# Altium footprint library THU VIEN V1.PcbLib: 400 footprints (part 17 of 25)
Each footprint in its own frame and in the unit in brackets; x right, y up, seen from the top. Pads: shape width x height; smd on the part's side, far side on the other; paste and mask are expansions set on the pad; w line width, h text height; cw(c..) or ccw(c..) is an arc to the next point about the centre after c.
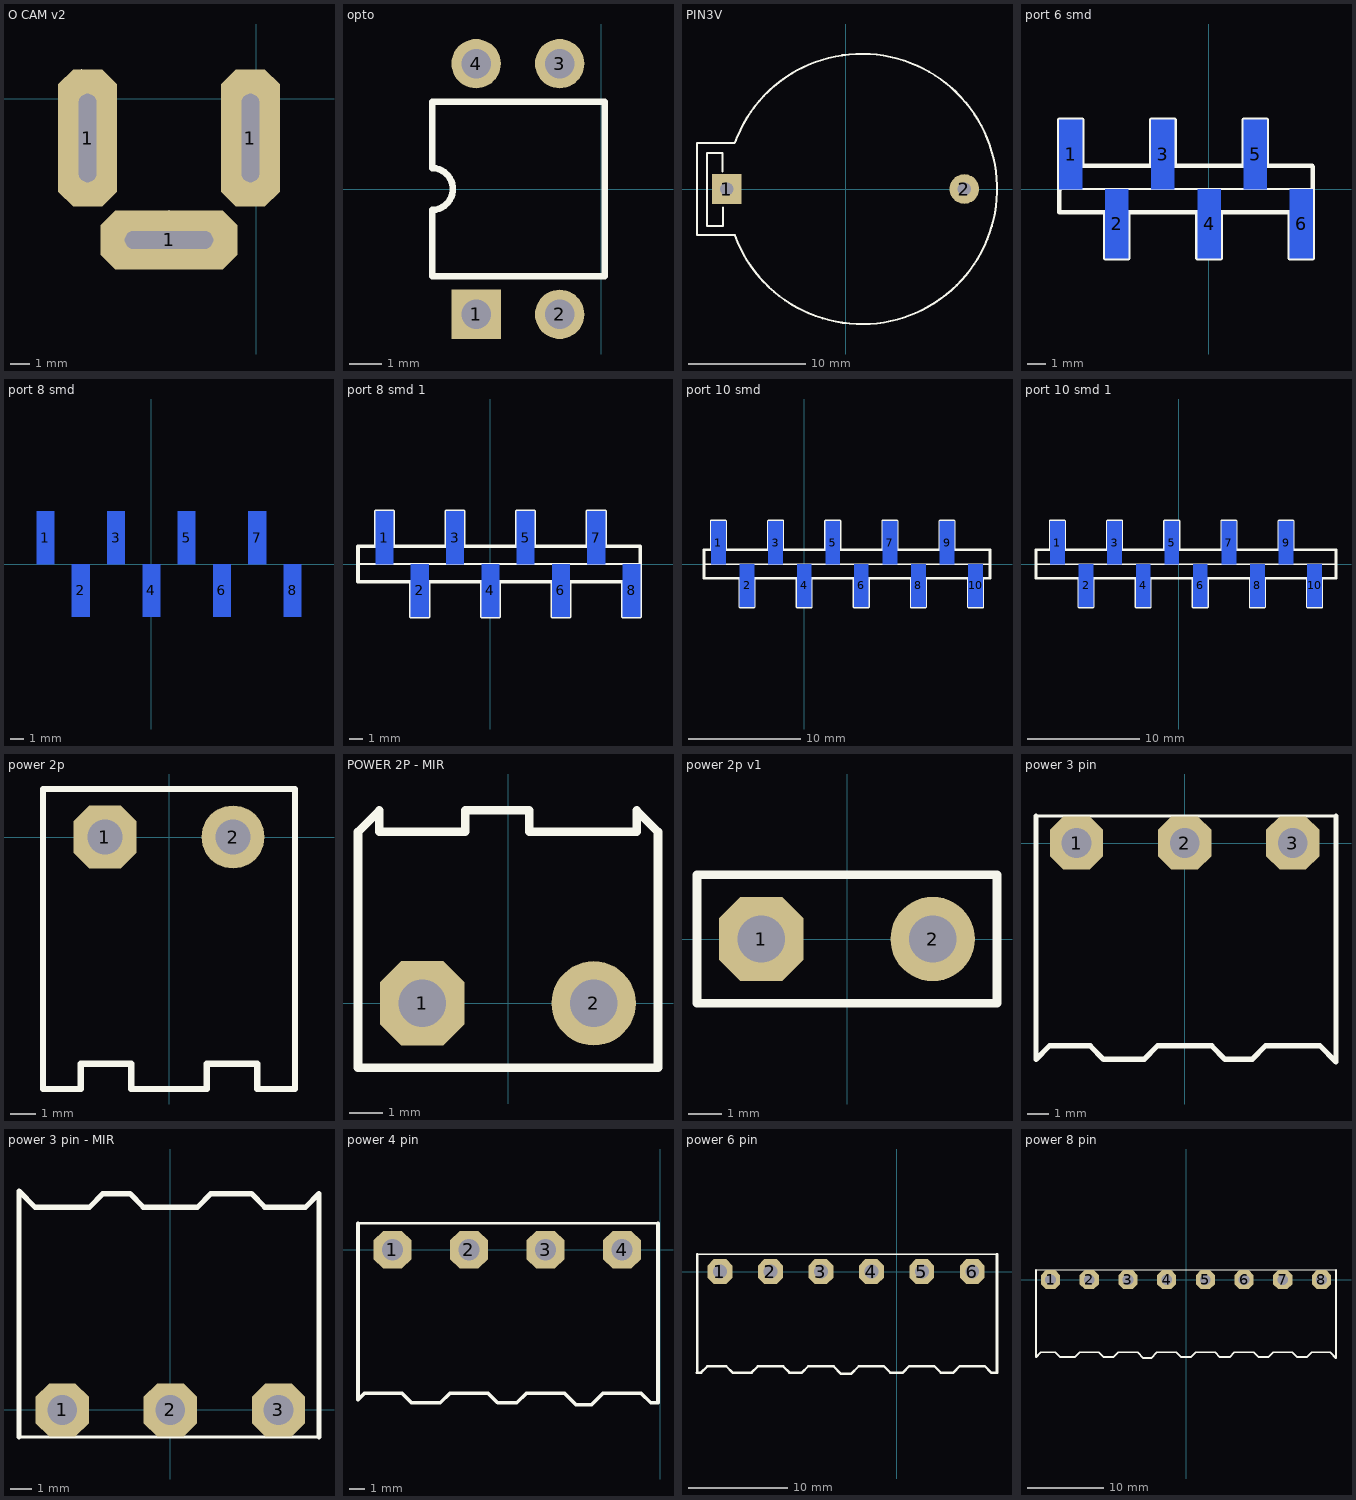
[diagram p16: the footprints below, top view; thin cyan lines are the x and y axes]

## O CAM v2 [mm]
pads (5):
  round 0.254 hole 0.127: 0(-4.45,-7.2) 0(-0.3,-2)
  oct 3x7 hole 0.9 slot 4.5 at 90 deg: 1(-8.6,-2) 1(-0.3,-2)
  oct 7x3 hole 0.9 slot 4.5 at 0 deg: 1(-4.45,-7.2)
Top Overlay:
  lines w0.025: -8.9,0 -8.9,1.5 ; -8.6,-4.5 -8.6,0.2 ; -4.45,-7.675 -4.45,-5.675 ; -4.45,-7.2 -2.45,-7.2
  lines w0.051: -8.9,-4 -8.9,0 ; -8.9,-4 -8.3,-4 ; -8.9,-4 -8.9,0 ; -8.9,-4 -8.3,-4 ; -8.9,0 -8.3,0 ; -8.9,0 -8.3,0 ; -8.3,-4 -8.3,0 ; -8.3,-4 -8.3,0 ; -6.45,-7.5 -2.45,-7.5 ; -6.45,-7.5 -6.45,-6.9 ; -6.45,-7.5 -2.45,-7.5 ; -6.45,-7.5 -6.45,-6.9 ; -6.45,-7.5 -2.45,-7.5 ; -6.45,-6.9 -2.45,-6.9 ; -6.45,-6.9 -2.45,-6.9 ; -2.45,-7.5 -2.45,-6.9 ; -2.45,-7.5 -2.45,-6.9 ; -0.6,-4 -0.6,0 ; -0.6,-4 0,-4 ; -0.6,-4 -0.6,0 ; -0.6,-4 0,-4 ; -0.6,0 0,0 ; -0.6,0 0,0 ; 0,-4 0,0 ; 0,-4 0,0
3D body: height 15.59, standoff -2.5, extent -8.947,-7.5 -0.003,0.972

## opto [mm] "DIP; 8 Leads; Row Spacing 7.62 mm; Pitch 2.54 mm"
height 5.08
pads (4):
  rect 1.5x1.5 hole 0.9: 1(-3.81,-3.81)
  round 1.5 hole 0.9: 2(-1.27,-3.81) 3(-1.27,3.81) 4(-3.81,3.81)
Top Overlay:
  lines w0.2: -5.15,-2.65 0.102,-2.65 0.102,2.65 -5.15,2.65 -5.15,0.635 cw(c-5.15,0) -5.15,-0.635 -5.15,-2.65
3D body: height 3.81, standoff -5.37, extent -4.955,-6.551 -0.125,6.551

## PIN3V [mil]
pads (2):
  rect 100x100 hole 45: 1(-400,0)
  round 100 hole 45: 2(400,0)
Top Overlay:
  lines w7: -414,59 -414,121 -466,121 -466,-124 -413,-124 -413,-63 ; -373.67,155 -500,155 -500,-155 -372.07,-155 ; -372.4,156.07 cw(c55,0) -372.07,-156.96
3D body: height 278.16, standoff -137.2, extent -528.08,-446.83 601.84,448.84

## port 6 smd [mm]
pads (6):
  rect 1.27x3.81 smd far side: 1(-7.605,1.925) 2(-5.065,-1.885) 3(-2.525,1.925) 4(0.015,-1.885) 5(2.555,1.925) 6(5.095,-1.885)
Top Overlay:
  lines w0.127: -8.128,0 5.73,0.02
  lines w0.254: -8.24,-1.25 -8.24,1.29 -8.24,3.83 -6.97,3.83 -6.97,1.29 -3.16,1.29 -3.16,3.83 -1.89,3.83 -1.89,1.29 1.92,1.29 1.92,3.83 3.19,3.83 3.19,1.29 5.695,1.29 5.73,1.255 5.73,-1.25 5.73,-3.79 4.46,-3.79 4.46,-1.25 0.65,-1.25 0.65,-3.79 -0.62,-3.79 -0.62,-1.25 -4.43,-1.25 -4.43,-3.79 -5.7,-3.79 -5.7,-1.25 -8.24,-1.25

## port 8 smd [mm]
pads (8):
  rect 1.27x3.81 smd far side: 1(-7.605,1.925) 2(-5.065,-1.885) 3(-2.525,1.925) 4(0.015,-1.885) 5(2.555,1.925) 6(5.095,-1.885) 7(7.635,1.925) 8(10.175,-1.885)

## port 8 smd 1 [mm]
pads (8):
  rect 1.27x3.81 smd far side: 1(-7.605,1.925) 2(-5.065,-1.885) 3(-2.525,1.925) 4(0.015,-1.885) 5(2.555,1.925) 6(5.095,-1.885) 7(7.635,1.925) 8(10.175,-1.885)
Top Overlay:
  lines w0.127: -9.51,0.02 10.79,0.02
  lines w0.254: 10.79,1.29 8.27,1.29 8.27,3.83 7,3.83 7,1.29 3.19,1.29 3.19,3.83 1.92,3.83 1.92,1.29 -1.89,1.29 -1.89,3.83 -3.16,3.83 -3.16,1.29 -6.97,1.29 -6.97,3.83 -8.24,3.83 -8.24,1.29 -9.51,1.29 -9.51,-1.25 -5.7,-1.25 -5.7,-3.79 -4.43,-3.79 -4.43,-1.25 -0.62,-1.25 -0.62,-3.79 0.65,-3.79 0.65,-1.25 4.46,-1.25 4.46,-3.79 5.73,-3.79 5.73,-1.25 9.54,-1.25 9.54,-3.79 10.81,-3.79 10.81,1.27

## port 10 smd [mm]
pads (10):
  rect 1.27x3.81 smd far side: 1(-7.62,1.905) 2(-5.08,-1.905) 3(-2.54,1.905) 4(0,-1.905) 5(2.54,1.905) 6(5.08,-1.905) 7(7.62,1.905) 8(10.16,-1.905) 9(12.7,1.905) 10(15.24,-1.905)
Top Overlay:
  lines w0.127: -8.89,0 16.51,0
  lines w0.254: -8.89,-1.27 -5.715,-1.27 -5.715,-3.81 -4.445,-3.81 -4.445,-1.27 -0.635,-1.27 -0.635,-3.81 0.635,-3.81 0.635,-1.27 4.445,-1.27 4.445,-3.81 5.715,-3.81 5.715,-1.27 9.525,-1.27 9.525,-3.81 10.795,-3.81 10.795,-1.27 13.97,-1.27 14.605,-1.27 14.605,-3.81 15.875,-3.81 15.875,-1.27 16.51,-1.27 16.51,1.27 13.97,1.27 13.335,1.27 13.335,3.81 12.065,3.81 12.065,1.27 8.255,1.27 8.255,3.81 6.985,3.81 6.985,1.27 3.175,1.27 3.175,3.81 1.905,3.81 1.905,1.27 -1.905,1.27 -1.905,3.81 -3.175,3.81 -3.175,1.27 -6.985,1.27 -6.985,3.81 -8.255,3.81 -8.255,1.27 -8.89,1.27 -8.89,-1.27
3D body: height -0.48, standoff -10.32, extent -8.89,-2.5 16.51,2.5

## port 10 smd 1 [mm]
pads (10):
  rect 1.27x3.81 smd far side: 1(-10.795,1.905) 2(-8.255,-1.905) 3(-5.715,1.905) 4(-3.175,-1.905) 5(-0.635,1.905) 6(1.905,-1.905) 7(4.445,1.905) 8(6.985,-1.905) 9(9.525,1.905) 10(12.065,-1.905)
Top Overlay:
  lines w0.127: -12.7,0 13.97,0
  lines w0.254: -12.7,-1.27 -8.89,-1.27 -8.89,-3.81 -7.62,-3.81 -7.62,-1.27 -3.81,-1.27 -3.81,-3.81 -2.54,-3.81 -2.54,-1.27 1.27,-1.27 1.27,-3.81 2.54,-3.81 2.54,-1.27 6.35,-1.27 6.35,-3.81 7.62,-3.81 7.62,-1.27 11.43,-1.27 11.43,-3.81 12.7,-3.81 12.7,-1.27 13.97,-1.27 13.97,1.27 10.16,1.27 10.16,3.81 8.89,3.81 8.89,1.27 5.08,1.27 5.08,3.81 3.81,3.81 3.81,1.27 0,1.27 0,3.81 -1.27,3.81 -1.27,1.27 -5.08,1.27 -5.08,3.81 -6.35,3.81 -6.35,1.27 -10.16,1.27 -10.16,3.81 -11.43,3.81 -11.43,1.27 -12.7,1.27 -12.7,-1.27

## power 2p [mm]
pads (2):
  oct 2.5x2.5 hole 1.397: 1(-2.54,0)
  round 2.5 hole 1.397: 2(2.54,0)
Top Overlay:
  lines w0.254: 5,-10 3.5,-10 3.5,-9 1.5,-9 1.5,-10 -1.5,-10 -1.5,-9 -3.5,-9 -3.5,-10 -5,-10 -5,-5.635 -5,1.905 5,1.905 5,-9.945
3D body: height 8.77, standoff -3.7, extent -5.04,-10.273 4.96,1.727

## POWER 2P - MIR [mm]
pads (2):
  oct 2.5x2.5 hole 1.397: 1(-2.54,0)
  round 2.5 hole 1.397: 2(2.54,0)
Top Overlay:
  lines w0.254: -4.445,-1.905 -4.445,5.08 -3.81,5.715 -3.81,5.08 -1.27,5.08 -1.27,5.715 0.635,5.715 0.635,5.08 3.81,5.08 3.81,5.715 4.445,5.08 4.445,-1.905 -4.445,-1.905

## power 2p v1 [mm]
pads (2):
  oct 2.5x2.5 hole 1.397: 1(-2.54,0)
  round 2.5 hole 1.397: 2(2.54,0)
Top Overlay:
  lines w0.254: -4.445,-1.905 4.445,-1.905 4.445,1.905 -4.445,1.905 -4.445,-1.905
3D body: height 8.47, standoff -4, extent -5.04,-10.273 4.96,1.727

## power 3 pin [mm] "hkgvh"
pads (3):
  oct 2.5x2.5 hole 1.4: 1(-5.08,0) 2(0,0) 3(5.08,0)
Top Overlay:
  lines w0.15: -6.985,1.27 7.112,1.27
  lines w0.254: -6.985,1.27 -6.985,-10.16 -6.35,-9.525 -4.445,-9.525 -3.81,-10.16 -1.905,-10.16 -1.27,-9.525 1.27,-9.525 1.905,-10.16 3.175,-10.16 3.81,-9.525 6.35,-9.525 7.112,-10.287 7.112,1.27
3D body: height 8.47, standoff -4, extent -2.525,-10.273 7.475,1.727
3D body: height 8.47, standoff -4, extent -7.544,-10.267 2.456,1.733

## power 3 pin - MIR [mm] "hkgvh"
pads (3):
  oct 2.5x2.5 hole 1.4: 1(-5.08,0) 2(0,0) 3(5.08,0)
Top Overlay:
  lines w0.15: -7.112,-1.27 6.985,-1.27
  lines w0.254: -7.112,-1.27 -7.112,10.287 -6.35,9.525 -3.81,9.525 -3.175,10.16 -1.905,10.16 -1.27,9.525 1.27,9.525 1.905,10.16 3.81,10.16 4.445,9.525 6.35,9.525 6.985,10.16 6.985,-1.27

## power 4 pin [mm] "hkgvh"
pads (4):
  oct 2.5x2.5 hole 1.4: 1(-17.78,0) 2(-12.7,0) 3(-7.62,0) 4(-2.54,0)
Top Overlay:
  lines w0.15: -20.066,1.753 -0.152,1.753
  lines w0.254: -20.066,1.753 -20.066,0.86 -20.066,-0.111 -20.066,-1.206 -20.066,-6.921 -20.066,-9.957 -19.634,-9.525 -17.145,-9.525 -16.51,-10.16 -14.605,-10.16 -13.97,-9.525 -11.43,-9.525 -10.795,-10.16 -9.525,-10.16 -8.89,-9.525 -6.35,-9.525 -5.588,-10.287 -4.572,-10.287 -3.81,-9.525 -1.27,-9.525 -0.635,-10.16 -0.152,-10.16 -0.152,1.753
3D body: height 8.47, standoff -4, extent -10.094,-10.222 -0.094,1.778
3D body: height 8.47, standoff -4, extent -20.153,-10.222 -10.153,1.778

## power 6 pin [mm] "hkgvh"
pads (6):
  oct 2.5x2.5 hole 1.4: 1(-17.78,0) 2(-12.7,0) 3(-7.62,0) 4(-2.54,0) 5(2.54,0) 6(7.62,0)
Top Overlay:
  lines w0.15: -20.066,1.753 10.109,1.753
  lines w0.254: -20.066,1.753 -20.066,-10.135 -20.091,-10.16 -19.685,-10.16 -19.05,-9.525 -17.145,-9.525 -16.51,-10.16 -14.605,-10.16 -13.97,-9.525 -11.43,-9.525 -10.795,-10.16 -9.525,-10.16 -8.89,-9.525 -6.35,-9.525 -5.588,-10.287 -4.572,-10.287 -3.81,-9.525 -1.27,-9.525 -0.635,-10.16 0.635,-10.16 1.27,-9.525 3.81,-9.525 4.445,-10.16 5.715,-10.16 6.35,-9.525 8.89,-9.525 9.525,-10.16 10.109,-10.16 10.109,1.753
3D body: height 8.47, standoff -4, extent -0.025,-10.191 9.975,1.809
3D body: height 8.47, standoff -4, extent -10.094,-10.222 -0.094,1.778
3D body: height 8.47, standoff -4, extent -20.153,-10.222 -10.153,1.778

## power 8 pin [mm] "hkgvh"
pads (8):
  oct 2.5x2.5 hole 1.4: 1(-17.78,0) 2(-12.7,0) 3(-7.62,0) 4(-2.54,0) 5(2.54,0) 6(7.62,0) 7(12.7,0) 8(17.78,0)
Top Overlay:
  lines w0.15: -19.685,1.27 19.685,1.27
  lines w0.254: -19.685,1.27 -19.685,-10.16 -19.05,-9.525 -17.145,-9.525 -16.51,-10.16 -14.605,-10.16 -13.97,-9.525 -11.43,-9.525 -10.795,-10.16 -9.525,-10.16 -8.89,-9.525 -6.35,-9.525 -5.588,-10.287 -4.572,-10.287 -3.81,-9.525 -1.27,-9.525 -0.635,-10.16 0.635,-10.16 1.27,-9.525 3.81,-9.525 4.445,-10.16 5.715,-10.16 6.35,-9.525 8.89,-9.525 9.525,-10.16 10.795,-10.16 11.43,-9.525 13.97,-9.525 14.605,-10.16 15.875,-10.16 16.51,-9.525 18.923,-9.525 19.685,-10.287 19.685,1.27
3D body: height 8.47, standoff -4, extent 10.2,-10.273 20.2,1.727
3D body: height 8.47, standoff -4, extent 0.091,-10.323 10.091,1.677
3D body: height 8.47, standoff -4, extent -10.094,-10.222 -0.094,1.778
3D body: height 8.47, standoff -4, extent -20.153,-10.222 -10.153,1.778